# Altium footprint library PcbLib.PcbLib: 79 footprints (part 2 of 5)
Each footprint in its own frame and in the unit in brackets; x right, y up, seen from the top. Pads: shape width x height; smd on the part's side, far side on the other; paste and mask are expansions set on the pad; w line width, h text height; cw(c..) or ccw(c..) is an arc to the next point about the centre after c.
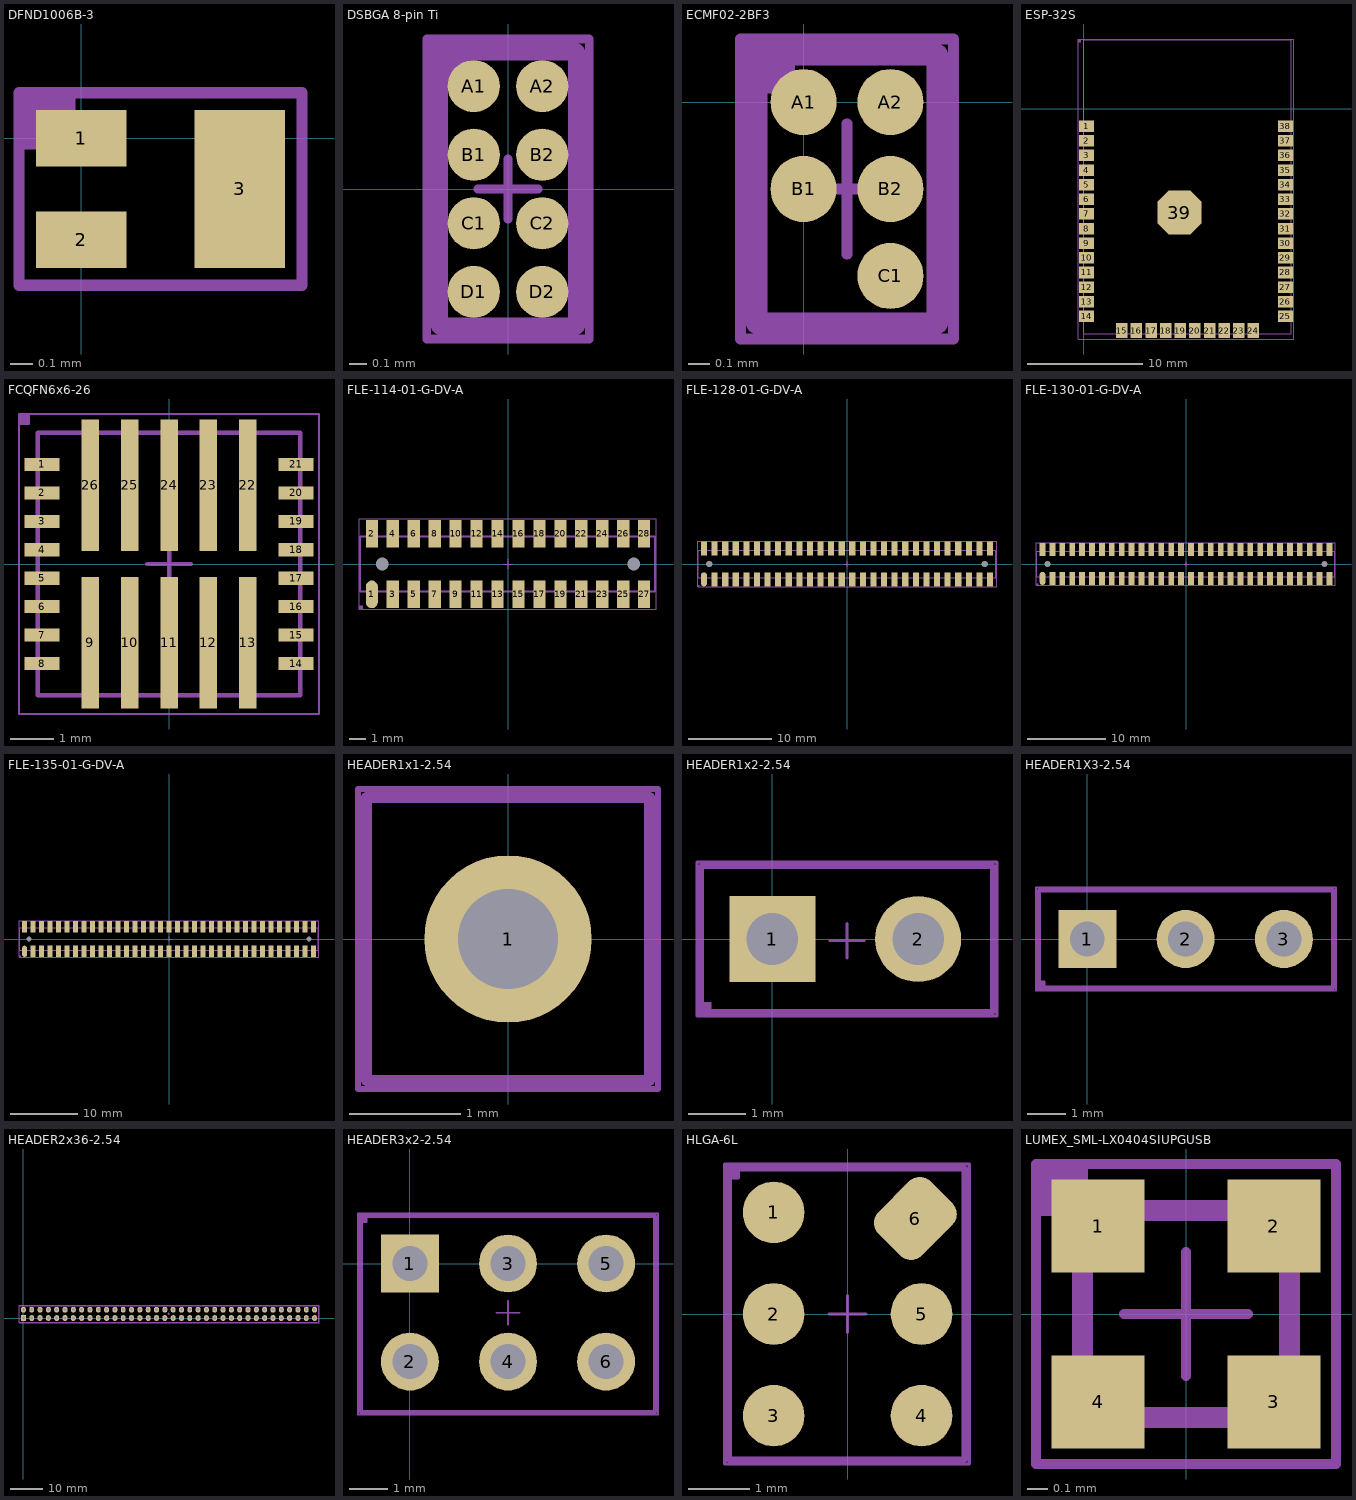
[diagram p1: the footprints below, top view; thin cyan lines are the x and y axes]

## DFND1006B-3 [mm]
height 0.37
pads (3):
  rect 0.4x0.25 smd paste-4 mask+0.05: 1(0,0) 2(0,-0.45)
  rect 0.4x0.7 smd paste-0.05 mask+0.05: 3(0.7,-0.225)
Top Paste:
  region: -0.15,0.125 0.15,0.125 0.15,-0.125 -0.15,-0.125
  region: -0.15,-0.325 0.15,-0.325 0.15,-0.575 -0.15,-0.575
TopCourtyard:
  region: -0.275,0.2 -0.275,-0.025 -0.05,-0.025 -0.05,0.2
  lines w0.05: -0.275,-0.025 -0.05,-0.025 -0.05,0.2 ; -0.275,-0.65 -0.275,0.2 0.975,0.2 0.975,-0.65 -0.275,-0.65
3D body: height 0.35, standoff 0.1, extent -0.125,-0.25 -0.025,-0.2
3D body: height 0.34, standoff 0, extent -0.15,-0.525 0.85,0.075

## DSBGA 8-pin Ti [mm]
height 0.5
pads (8):
  round 0.304 smd paste-0.039 mask-0.039: A1(-0.2,0.6) A2(0.2,0.6) B1(-0.2,0.2) B2(0.2,0.2) C1(-0.2,-0.2) C2(0.2,-0.2) D1(-0.2,-0.6) D2(0.2,-0.6)
TopBody:
  lines w0.1: -0.4,-0.8 0.4,-0.8 0.4,0.8 -0.4,0.8 -0.4,-0.8
TopCourtyard:
  region: -0.475,0.875 -0.475,0.65 -0.25,0.65 -0.25,0.875
  lines w0.05: -0.475,0.65 -0.25,0.65 -0.25,0.875 ; -0.175,0 0.175,0 ; 0,-0.175 0,0.175 ; -0.475,-0.875 0.475,-0.875 0.475,0.875 -0.475,0.875 -0.475,-0.875
3D body: height 0.5, standoff 0, extent -0.4,-0.8 0.4,0.8
3D body: height 0.51, standoff 0.5, extent -0.304,0.495 -0.104,0.695

## ECMF02-2BF3 [mm] "USB DP-DM line protection"
height 0.5
pads (5):
  round 0.304 smd paste-0.039 mask-0.039: A1(0,0) A2(0.4,0) B1(0,-0.4) B2(0.4,-0.4) C1(0.4,-0.8)
TopBody:
  lines w0.1: -0.215,-1.017 -0.215,0.217 0.615,0.217 0.615,-1.017 -0.215,-1.017
TopCourtyard:
  region: -0.29,0.29 -0.29,0.065 -0.065,0.065 -0.065,0.29
  lines w0.05: -0.29,0.065 -0.065,0.065 -0.065,0.29 ; -0.1,-0.4 0.5,-0.4 ; 0.2,-0.7 0.2,-0.1 ; -0.29,-1.09 0.69,-1.09 0.69,0.29 -0.29,0.29 -0.29,-1.09
3D body: height 0.58, standoff 0, extent 0,0 0,0
3D body: height 0.59, standoff 0.58, extent -0.135,-0.062 0.064,0.137
3D body: height 0.58, standoff 0, extent -0.215,-1.017 0.615,0.217

## ESP-32S [mm]
pads (39):
  rect 1.3x1 smd mask+0.05: 1(0.25,-1.5) 2(0.25,-2.77) 3(0.25,-4.04) 4(0.25,-5.31) 5(0.25,-6.58) 6(0.25,-7.85) 7(0.25,-9.12) 8(0.25,-10.39) 9(0.25,-11.66) 10(0.25,-12.93) 11(0.25,-14.2) 12(0.25,-15.47) 13(0.25,-16.74) 14(0.25,-18.01) 25(17.5,-18.01) 26(17.5,-16.74) 27(17.5,-15.47) 28(17.5,-14.2) 29(17.5,-12.93) 30(17.5,-11.66) 31(17.5,-10.39) 32(17.5,-9.12) 33(17.5,-7.85) 34(17.5,-6.58) 35(17.5,-5.31) 36(17.5,-4.04) 37(17.5,-2.77) 38(17.5,-1.5)
  rect 1x1.3 smd mask+0.05: 15(3.3,-19.25) 16(4.57,-19.25) 17(5.84,-19.25) 18(7.11,-19.25) 19(8.38,-19.25) 20(9.65,-19.25) 21(10.92,-19.25) 22(12.19,-19.25) 23(13.46,-19.25) 24(14.73,-19.25)
  oct 3.8x3.8 smd mask+0.1: 39(8.3,-9)
TopBody:
  lines w0.1: 0,-19.5 0,6 18,6 18,-19.5 0,-19.5
TopCourtyard:
  region: -0.475,6.075 -0.475,5.85 -0.25,5.85 -0.25,6.075
  lines w0.05: -0.475,5.85 -0.25,5.85 -0.25,6.075 ; 8.425,-9.1 9.025,-9.1 ; 8.725,-9.4 8.725,-8.8 ; -0.475,-19.975 18.225,-19.975 18.225,6.075 -0.475,6.075 -0.475,-19.975
3D body: height 1, standoff 0, extent 0,-19.5 18,6
3D body: height 3.3, standoff 0, extent 0.25,-19.15 17.65,-0.65

## FCQFN6x6-26 [mm]
height 1
pads (26):
  rect 0.8x0.3 smd: 1(-2.9,2.275) 2(-2.9,1.625) 3(-2.9,0.975) 4(-2.9,0.325) 5(-2.9,-0.325) 6(-2.9,-0.975) 7(-2.9,-1.625) 8(-2.9,-2.275) 14(2.9,-2.275) 15(2.9,-1.625) 16(2.9,-0.975) 17(2.9,-0.325) 18(2.9,0.325) 19(2.9,0.975) 20(2.9,1.625) 21(2.9,2.275)
  rect 0.4x3 smd: 9(-1.8,-1.8) 10(-0.9,-1.8) 11(0,-1.8) 12(0.9,-1.8) 13(1.8,-1.8) 22(1.8,1.8) 23(0.9,1.8) 24(0,1.8) 25(-0.9,1.8) 26(-1.8,1.8)
TopBody:
  lines w0.1: -3,-3 -3,3 3,3 3,-3 -3,-3
TopCourtyard:
  region: -3.43,3.425 -3.43,3.2 -3.205,3.2 -3.205,3.425
  lines w0.05: -3.43,3.2 -3.205,3.2 -3.205,3.425 ; -3.43,-3.425 -3.43,3.425 3.425,3.425 3.425,-3.425 -3.43,-3.425
  lines w0.1: -0.5,0 0.5,0 ; 0,-0.5 0,0.5
3D body: height 1.01, standoff 1, extent -2.61,2.028 -2.011,2.626
3D body: height 1, standoff 0, extent -3,-3 3,3

## FLE-114-01-G-DV-A [mil]
pads (30):
  oval 29x66 smd mask+2: 1(-325,-72.5)
  rect 29x66 smd mask+2: 2(-325,72.5) 3(-275,-72.5) 4(-275,72.5) 5(-225,-72.5) 6(-225,72.5) 7(-175,-72.5) 8(-175,72.5) 9(-125,-72.5) 10(-125,72.5) 11(-75,-72.5) 12(-75,72.5) 13(-25,-72.5) 14(-25,72.5) 15(25,-72.5) 16(25,72.5) 17(75,-72.5) 18(75,72.5) 19(125,-72.5) 20(125,72.5) 21(175,-72.5) 22(175,72.5) 23(225,-72.5) 24(225,72.5) 25(275,-72.5) 26(275,72.5) 27(325,-72.5) 28(325,72.5)
  round 0 hole 30 unplated: 61(-300,0) 62(300,0)
TopBody:
  lines w3.94: 349.41,65.5 -352.25,65.5 -352.25,-65.5 350.39,-65.5 ; 350,-65.5 350,65.5
TopCourtyard:
  region: -355.12,-99.6 -355.12,-108.46 -346.25,-108.46 -346.25,-99.6
  lines w1.97: -355.12,-99.6 -346.25,-99.6 -346.25,-108.46 ; -11.81,0 11.81,0 ; 0,-11.81 0,11.81 ; -355.12,-108.46 353.35,-108.46 353.35,108.46 -355.12,108.46 -355.12,-108.46
3D body "FLE-114-01-G-DV-A.stp": height 178.69, standoff -23.31, extent -352.14,-90.45 352.36,90.45

## FLE-128-01-G-DV-A [mil]
pads (58):
  oval 29x66 smd mask+2: 1(-675,-72.5)
  rect 29x66 smd mask+2: 2(-675,72.5) 3(-625,-72.5) 4(-625,72.5) 5(-575,-72.5) 6(-575,72.5) 7(-525,-72.5) 8(-525,72.5) 9(-475,-72.5) 10(-475,72.5) 11(-425,-72.5) 12(-425,72.5) 13(-375,-72.5) 14(-375,72.5) 15(-325,-72.5) 16(-325,72.5) 17(-275,-72.5) 18(-275,72.5) 19(-225,-72.5) 20(-225,72.5) 21(-175,-72.5) 22(-175,72.5) 23(-125,-72.5) 24(-125,72.5) 25(-75,-72.5) 26(-75,72.5) 27(-25,-72.5) 28(-25,72.5) 29(25,-72.5) 30(25,72.5) 31(75,-72.5) 32(75,72.5) 33(125,-72.5) 34(125,72.5) 35(175,-72.5) 36(175,72.5) 37(225,-72.5) 38(225,72.5) 39(275,-72.5) 40(275,72.5) 41(325,-72.5) 42(325,72.5) 43(375,-72.5) 44(375,72.5) 45(425,-72.5) 46(425,72.5) 47(475,-72.5) 48(475,72.5) 49(525,-72.5) 50(525,72.5) 51(575,-72.5) 52(575,72.5) 53(625,-72.5) 54(625,72.5) 55(675,-72.5) 56(675,72.5)
  round 0 hole 30 unplated: 61(-650,0) 62(650,0)
TopBody:
  lines w3.94: -702.25,-65.5 702.76,-65.5 702.76,65.5 -702.25,65.5 -702.25,-65.5
TopCourtyard:
  region: -705.12,-99.6 -705.12,-108.46 -696.25,-108.46 -696.25,-99.6
  lines w1.97: -705.12,-99.6 -696.25,-99.6 -696.25,-108.46 ; -11.81,0 11.81,0 ; 0,-11.81 0,11.81 ; -705.12,-108.46 -705.12,108.46 705.71,108.46 705.71,-108.46 -705.12,-108.46
3D body "FLE-128-01-G-DV-A.stp": height 178.69, standoff -23.31, extent -701.74,-90.45 702.76,90.45

## FLE-130-01-G-DV-A [mil]
pads (62):
  oval 29x66 smd mask+2: 1(-725,-72.5)
  rect 29x66 smd mask+2: 2(-725,72.5) 3(-675,-72.5) 4(-675,72.5) 5(-625,-72.5) 6(-625,72.5) 7(-575,-72.5) 8(-575,72.5) 9(-525,-72.5) 10(-525,72.5) 11(-475,-72.5) 12(-475,72.5) 13(-425,-72.5) 14(-425,72.5) 15(-375,-72.5) 16(-375,72.5) 17(-325,-72.5) 18(-325,72.5) 19(-275,-72.5) 20(-275,72.5) 21(-225,-72.5) 22(-225,72.5) 23(-175,-72.5) 24(-175,72.5) 25(-125,-72.5) 26(-125,72.5) 27(-75,-72.5) 28(-75,72.5) 29(-25,-72.5) 30(-25,72.5) 31(25,-72.5) 32(25,72.5) 33(75,-72.5) 34(75,72.5) 35(125,-72.5) 36(125,72.5) 37(175,-72.5) 38(175,72.5) 39(225,-72.5) 40(225,72.5) 41(275,-72.5) 42(275,72.5) 43(325,-72.5) 44(325,72.5) 45(375,-72.5) 46(375,72.5) 47(425,-72.5) 48(425,72.5) 49(475,-72.5) 50(475,72.5) 51(525,-72.5) 52(525,72.5) 53(575,-72.5) 54(575,72.5) 55(625,-72.5) 56(625,72.5) 57(675,-72.5) 58(675,72.5) 59(725,-72.5) 60(725,72.5)
  round 0 hole 30 unplated: 61(-700,0) 62(700,0)
TopBody:
  lines w3.94: -752.95,-65.5 -752.95,65.5 751.55,65.5 751.55,-65.5 -752.95,-65.5
TopCourtyard:
  region: -755.91,-99.4 -755.91,-108.27 -747.04,-108.27 -747.04,-99.4
  lines w1.97: -755.91,-99.4 -747.04,-99.4 -747.04,-108.27 ; -11.81,0 11.81,0 ; 0,-11.81 0,11.81 ; -755.91,-108.27 -755.91,108.46 754.53,108.46 754.53,-108.27 -755.91,-108.27
3D body "FLE-130-01-G-DV-A.stp": height 179.87, standoff -22.13, extent -752.95,-90.45 751.55,90.45

## FLE-135-01-G-DV-A [mil]
pads (72):
  oval 29x66 smd mask+2: 1(-850,-72.5)
  rect 29x66 smd mask+2: 2(-850,72.5) 3(-800,-72.5) 4(-800,72.5) 5(-750,-72.5) 6(-750,72.5) 7(-700,-72.5) 8(-700,72.5) 9(-650,-72.5) 10(-650,72.5) 11(-600,-72.5) 12(-600,72.5) 13(-550,-72.5) 14(-550,72.5) 15(-500,-72.5) 16(-500,72.5) 17(-450,-72.5) 18(-450,72.5) 19(-400,-72.5) 20(-400,72.5) 21(-350,-72.5) 22(-350,72.5) 23(-300,-72.5) 24(-300,72.5) 25(-250,-72.5) 26(-250,72.5) 27(-200,-72.5) 28(-200,72.5) 29(-150,-72.5) 30(-150,72.5) 31(-100,-72.5) 32(-100,72.5) 33(-50,-72.5) 34(-50,72.5) 35(0,-72.5) 36(0,72.5) 37(50,-72.5) 38(50,72.5) 39(100,-72.5) 40(100,72.5) 41(150,-72.5) 42(150,72.5) 43(200,-72.5) 44(200,72.5) 45(250,-72.5) 46(250,72.5) 47(300,-72.5) 48(300,72.5) 49(350,-72.5) 50(350,72.5) 51(400,-72.5) 52(400,72.5) 53(450,-72.5) 54(450,72.5) 55(500,-72.5) 56(500,72.5) 57(550,-72.5) 58(550,72.5) 59(600,-72.5) 60(600,72.5) 61(650,-72.5) 62(650,72.5) 63(700,-72.5) 64(700,72.5) 65(750,-72.5) 66(750,72.5) 67(800,-72.5) 68(800,72.5) 69(850,-72.5) 70(850,72.5)
  round 0 hole 30 unplated: 61(-825,0) 62(825,0)
TopBody:
  lines w3.94: -877.25,-65.5 877.26,-65.5 877.26,65.5 -877.25,65.5 -877.25,-65.5
TopCourtyard:
  region: -880.32,-99.6 -880.32,-108.46 -871.45,-108.46 -871.45,-99.6
  lines w1.97: -880.32,-99.6 -871.45,-99.6 -871.45,-108.46 ; -11.81,0 11.81,0 ; 0,-11.81 0,11.81 ; -880.32,-108.46 -880.32,108.46 880.32,108.46 880.32,-108.46 -880.32,-108.46
3D body "FLE-135-01-G-DV-A.stp": height 179.87, standoff -22.13, extent -877.24,-90.44 877.26,90.46

## HEADER1x1-2.54 [mm]
pads (1):
  round 1.5 hole 0.9: 1(0,0)
TopBody:
  lines w0.1: -1.27,-1.27 -1.27,1.27 1.27,1.27 1.27,-1.27 -1.27,-1.27
TopCourtyard:
  lines w0.05: -0.3,0 0.3,0 ; 0,-0.3 0,0.3 ; -1.345,-1.345 1.345,-1.345 1.345,1.345 -1.345,1.345 -1.345,-1.345

## HEADER1x2-2.54 [mm]
pads (2):
  rect 1.5x1.5 hole 0.9: 1(0,0)
  round 1.5 hole 0.9: 2(2.54,0)
TopBody:
  lines w0.1: -1.24,-1.27 -1.24,1.27 3.84,1.27 3.84,-1.27 -1.24,-1.27
TopCourtyard:
  region: -1.315,-1.12 -1.315,-1.345 -1.09,-1.345 -1.09,-1.12
  lines w0.05: -1.315,-1.12 -1.09,-1.12 -1.09,-1.345 ; 1,-0.03 1.6,-0.03 ; 1.3,-0.33 1.3,0.27 ; -1.315,-1.345 -1.315,1.345 3.915,1.345 3.915,-1.345 -1.315,-1.345

## HEADER1X3-2.54 [mm]
pads (3):
  rect 1.5x1.5 hole 0.9: 1(0,0)
  round 1.5 hole 0.9: 2(2.54,0) 3(5.08,0)
TopBody:
  lines w0.1: -1.25,-1.25 -1.25,1.25 6.35,1.25 6.35,-1.25 -1.25,-1.25
TopCourtyard:
  region: -1.325,-1.1 -1.325,-1.325 -1.1,-1.325 -1.1,-1.1
  lines w0.05: -1.325,-1.1 -1.1,-1.1 -1.1,-1.325 ; 2.24,0 2.84,0 ; 2.54,-0.3 2.54,0.3 ; -1.325,-1.325 -1.325,1.325 6.425,1.325 6.425,-1.325 -1.325,-1.325

## HEADER2x36-2.54 [mm] "Connector; Header; 50 Positions"
pads (72):
  rect 1.5x1.8 hole 0.9: 1(0,0)
  oval 1.5x1.8 hole 0.9: 2(0,2.54) 3(2.54,0) 4(2.54,2.54) 5(5.08,0) 6(5.08,2.54) 7(7.62,0) 8(7.62,2.54) 9(10.16,0) 10(10.16,2.54) 11(12.7,0) 12(12.7,2.54) 13(15.24,0) 14(15.24,2.54) 15(17.78,0) 16(17.78,2.54) 17(20.32,0) 18(20.32,2.54) 19(22.86,0) 20(22.86,2.54) 21(25.4,0) 22(25.4,2.54) 23(27.94,0) 24(27.94,2.54) 25(30.48,0) 26(30.48,2.54) 27(33.02,0) 28(33.02,2.54) 29(35.56,0) 30(35.56,2.54) 31(38.1,0) 32(38.1,2.54) 33(40.64,0) 34(40.64,2.54) 35(43.18,0) 36(43.18,2.54) 37(45.72,0) 38(45.72,2.54) 39(48.26,0) 40(48.26,2.54) 41(50.8,0) 42(50.8,2.54) 43(53.34,0) 44(53.34,2.54) 45(55.88,0) 46(55.88,2.54) 47(58.42,0) 48(58.42,2.54) 49(60.96,0) 50(60.96,2.54) 51(63.5,0) 52(63.5,2.54) 53(66.04,0) 54(66.04,2.54) 55(68.58,0) 56(68.58,2.54) 57(71.12,0) 58(71.12,2.54) 59(73.66,0) 60(73.66,2.54) 61(76.2,0) 62(76.2,2.54) 63(78.74,0) 64(78.74,2.54) 65(81.28,0) 66(81.28,2.54) 67(83.82,0) 68(83.82,2.54) 69(86.36,0) 70(86.36,2.54) 71(88.9,0) 72(88.9,2.54)
TopBody:
  lines w0.1: 90.17,3.765 -1.27,3.765 -1.27,-1.3 90.17,-1.3 90.18,3.765
TopCourtyard:
  region: -1.345,-1.15 -1.345,-1.375 -1.12,-1.375 -1.12,-1.15
  lines w0.05: -1.345,-1.15 -1.12,-1.15 -1.12,-1.375 ; 44.135,1.255 44.735,1.255 ; 44.435,0.955 44.435,1.555 ; -1.345,-1.375 90.25,-1.375 90.25,3.84 -1.345,3.84 -1.345,-1.375

## HEADER3x2-2.54 [mm]
pads (6):
  rect 1.5x1.5 hole 0.9: 1(0,0)
  round 1.5 hole 0.9: 2(0,-2.54) 3(2.54,0) 4(2.54,-2.54) 5(5.08,0) 6(5.08,-2.54)
TopBody:
  lines w0.1: -1.27,-3.84 6.35,-3.84 6.35,1.225 -1.27,1.225 -1.27,-3.84
TopCourtyard:
  region: -1.345,1.3 -1.345,1.075 -1.12,1.075 -1.12,1.3
  lines w0.05: -1.345,1.075 -1.12,1.075 -1.12,1.3 ; 2.235,-1.275 2.835,-1.275 ; 2.535,-1.575 2.535,-0.975 ; -1.345,-3.915 6.425,-3.915 6.425,1.3 -1.345,1.3 -1.345,-3.915
3D body "Header1x3.STEP": height 8.43, standoff -2.55, extent -1.27,-3.81 6.35,-1.27
3D body "Header1x3.STEP": height 8.43, standoff -2.55, extent -1.27,-1.27 6.35,1.27

## HLGA-6L [mm]
pads (6):
  round 1 smd mask+0.05: 1(-1.2,1.65) 2(-1.2,0) 3(-1.2,-1.65) 4(1.2,-1.65) 5(1.2,0)
  rrect50% 1x1.2 smd rot 135 mask+0.05: 6(1.1,1.55)
TopBody:
  lines w0.1: -1.923,-2.362 1.9,-2.362 1.9,2.362 -1.923,2.362 -1.923,-2.362
TopCourtyard:
  region: -1.995,2.435 -1.995,2.21 -1.77,2.21 -1.77,2.435
  lines w0.05: -1.995,2.21 -1.77,2.21 -1.77,2.435 ; -0.3,0 0.3,0 ; 0,-0.3 0,0.3 ; -1.995,-2.435 -1.995,2.435 1.975,2.435 1.975,-2.435 -1.995,-2.435
3D body: height 1.25, standoff 0, extent -1.923,-2.362 1.9,2.362

## LUMEX_SML-LX0404SIUPGUSB [mm]
pads (4):
  rect 0.45x0.45 smd mask+0.05: 1(-0.425,0.425) 2(0.425,0.425) 3(0.425,-0.425) 4(-0.425,-0.425)
TopBody:
  lines w0.1: -0.5,0.275 -0.275,0.275 -0.275,0.5 ; -0.5,-0.5 -0.5,0.5 0.5,0.5 0.5,-0.5 -0.5,-0.5
TopCourtyard:
  region: -0.725,0.725 -0.725,0.5 -0.5,0.5 -0.5,0.725
  lines w0.05: -0.725,0.5 -0.5,0.5 -0.5,0.725 ; -0.724,0.499 -0.499,0.499 -0.499,0.724 ; -0.3,0 0.3,0 ; 0,-0.3 0,0.3 ; -0.725,-0.725 -0.725,0.725 0.725,0.725 0.725,-0.725 -0.725,-0.725
3D body "SML-LX0404SIUPGUSB.STEP": height 0.3, standoff 0, extent -0.5,-0.5 0.5,0.5
3D body: height 0.31, standoff 0.3, extent -0.421,0.221 -0.221,0.42